# Altium footprint library bethu.PcbLib: 628 footprints (part 1 of 40)
Each footprint in its own frame and in the unit in brackets; x right, y up, seen from the top. Pads: shape width x height; smd on the part's side, far side on the other; paste and mask are expansions set on the pad; w line width, h text height; cw(c..) or ccw(c..) is an arc to the next point about the centre after c.
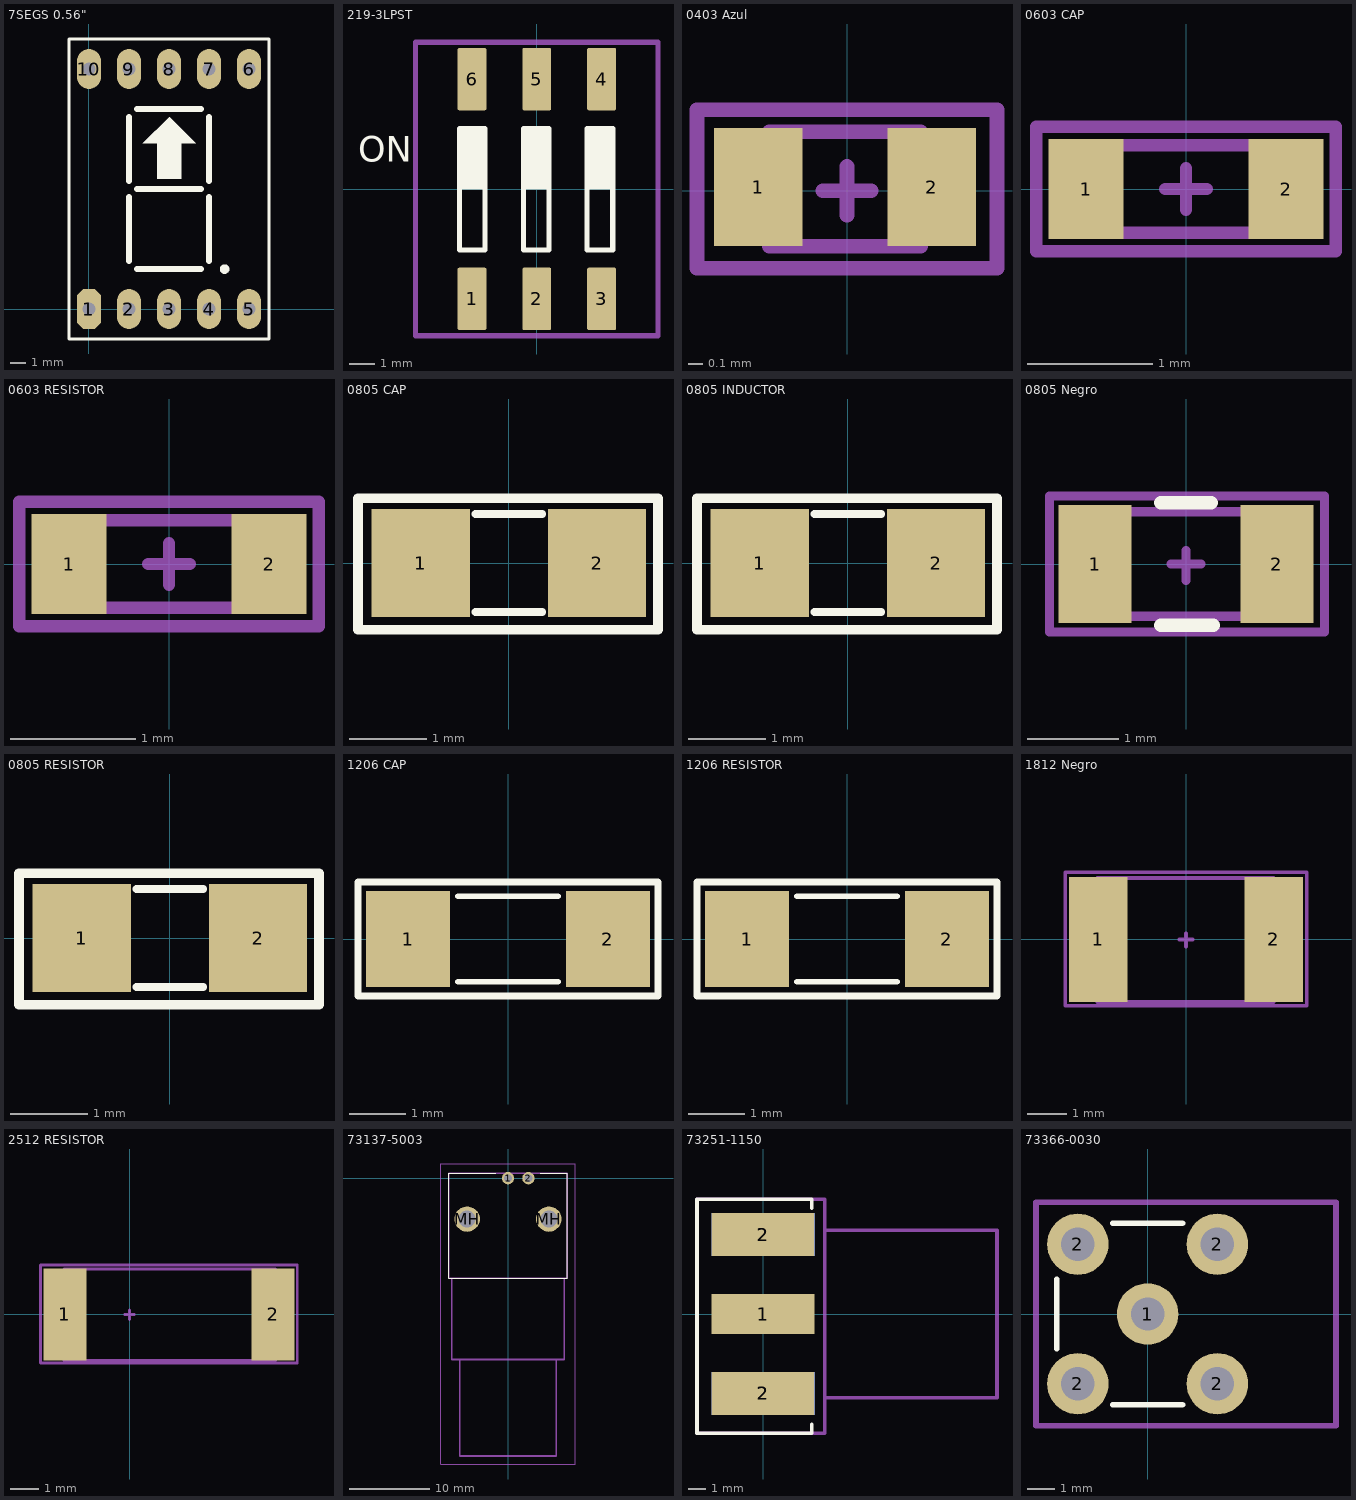
[diagram p0: the footprints below, top view; thin cyan lines are the x and y axes]

## 7SEGS 0.56" [mil] "DIP 10 Leads; Body 12 x 15 mm; Pitch 0.5 mm"
height 300
pads (10):
  oct 60x100 hole 32: 1(0.01,0.01)
  oval 60x100 hole 32: 2(100.01,0.01) 3(200.01,0.01) 4(300.01,0.01) 5(400.01,0.01) 6(400.01,600.01) 7(300.01,600.01) 8(200.01,600.01) 9(100.01,600.01) 10(0.01,600.01)
Top Overlay:
  circle w12: c339.01,100.01 r6
  region: 134.01,414.01 200.01,480.01 202.01,480.01 267.01,415.01 267.01,414.01 230.01,414.01 230.01,326.01 171.01,326.01 171.01,414.01
  lines w7: -49.99,-74.8 450.01,-74.8 450.01,675.01 -49.99,675.01 -49.99,-74.8
  lines w15: 100.01,120.01 100.01,280.01 ; 100.01,120.01 100.01,280.01 ; 100.01,120.01 100.01,280.01 ; 100.01,120.01 100.01,280.01 ; 100.01,120.01 100.01,280.01 ; 100.01,120.01 100.01,280.01 ; 100.01,120.01 100.01,280.01 ; 100.01,120.01 100.01,280.01 ; 100.01,320.01 100.01,480.01 ; 100.01,320.01 100.01,480.01 ; 100.01,320.01 100.01,480.01 ; 100.01,320.01 100.01,480.01 ; 100.01,320.01 100.01,480.01 ; 100.01,320.01 100.01,480.01 ; 100.01,320.01 100.01,480.01 ; 100.01,320.01 100.01,480.01 ; 120.01,100.01 280.01,100.01 ; 120.01,100.01 280.01,100.01 ; 120.01,100.01 280.01,100.01 ; 120.01,100.01 280.01,100.01 ; 120.01,300.01 280.01,300.01 ; 120.01,300.01 280.01,300.01 ; 120.01,300.01 280.01,300.01 ; 120.01,300.01 280.01,300.01 ; 120.01,300.01 280.01,300.01 ; 120.01,300.01 280.01,300.01 ; 120.01,300.01 280.01,300.01 ; 120.01,300.01 280.01,300.01 ; 120.01,500.01 280.01,500.01 ; 120.01,500.01 280.01,500.01 ; 120.01,500.01 280.01,500.01 ; 120.01,500.01 280.01,500.01 ; 300.01,120.01 300.01,280.01 ; 300.01,120.01 300.01,280.01 ; 300.01,120.01 300.01,280.01 ; 300.01,120.01 300.01,280.01 ; 300.01,120.01 300.01,280.01 ; 300.01,120.01 300.01,280.01 ; 300.01,120.01 300.01,280.01 ; 300.01,120.01 300.01,280.01 ; 300.01,320.01 300.01,480.01 ; 300.01,320.01 300.01,480.01 ; 300.01,320.01 300.01,480.01 ; 300.01,320.01 300.01,480.01 ; 300.01,320.01 300.01,480.01 ; 300.01,320.01 300.01,480.01 ; 300.01,320.01 300.01,480.01 ; 300.01,320.01 300.01,480.01
3D body "SW3dPS-Disp_SA56-11.STEP": height 316.25, standoff -156.19, extent -49.99,-74.99 450.01,675.01

## 219-3LPST [mm]
pads (6):
  rrect10% 1.13x2.44 smd mask+0: 1(-2.54,-4.305) 2(0,-4.305) 3(2.54,-4.305) 4(2.54,4.305) 5(0,4.305) 6(-2.54,4.305)
Top Overlay:
  region: 1.975,2.365 2.975,2.365 2.975,-0.01 1.975,-0.01
  region: -0.525,2.365 0.475,2.365 0.475,-0.01 -0.525,-0.01
  region: -3.025,2.365 -2.025,2.365 -2.025,-0.01 -3.025,-0.01
  lines w0.2: -3.025,-2.385 -2.025,-2.385 -2.025,2.365 -3.025,2.365 -3.025,-2.385 ; -0.525,-2.385 0.475,-2.385 0.475,2.365 -0.525,2.365 -0.525,-2.385 ; 1.975,-2.385 2.975,-2.385 2.975,2.365 1.975,2.365 1.975,-2.385
  text "ON" at -7.008,1.075 h1
Mechanical 13:
  lines w0.2: -4.75,-5.75 4.75,-5.75 4.75,-5.25 4.75,5.75 -4.75,5.75 -4.75,-5.75
  text "'.Designator'" at -5.84,-0.925 h1
3D body "219-3poles.stp": height 4.31, standoff 0.01, extent -4.545,-4.955 4.545,4.955

## 0403 Azul [mm] "Chip Resistor, Empaque 0403"
height 0.3
pads (2):
  rect 0.6x0.8 smd: 1(-0.6,0.025) 2(0.575,0.025)
Mechanical 13:
  lines w0.1: -0.525,-0.375 -0.525,0.4 0.5,0.4 0.5,-0.375 -0.525,-0.375
Mechanical 15:
  lines w0.1: -0.165,0 0.165,0 ; 0,-0.165 0,0.165 ; -1.016,-0.525 -1.016,0.55 1.016,0.55 1.016,-0.525 -1.016,-0.525
3D body "0403.STEP": height 0.85, standoff -0.01, extent -0.525,-0.425 0.491,0.439
3D body "0403.STEP": height 0.73, standoff -0.13, extent -0.525,-0.407 0.491,0.457

## 0603 CAP [mm] "Chip Resistor, Empaque 0603"
height 0.3
pads (2):
  rect 0.6x0.8 smd: 1(-0.8,0) 2(0.8,0)
Mechanical 13:
  lines w0.1: -0.8,-0.35 0.8,-0.35 0.8,0.35 -0.8,0.35 -0.8,-0.35
Mechanical 15:
  lines w0.1: -0.165,0 0.165,0 ; 0,-0.165 0,0.165 ; -1.2,-0.5 1.2,-0.5 1.2,0.5 -1.2,0.5 -1.2,-0.5
3D body "SW3dPS-0603 SMD Capacitor.STEP": height 0.29, standoff -0.01, extent -0.8,-0.4 0.8,0.4

## 0603 RESISTOR [mm] "Chip Resistor, Empaque 0603"
height 0.3
pads (2):
  rect 0.6x0.8 smd: 1(-0.8,0) 2(0.8,0)
Mechanical 13:
  lines w0.1: -0.8,-0.35 -0.8,0.35 0.8,0.35 0.8,-0.35 -0.8,-0.35
Mechanical 15:
  lines w0.1: -0.165,0 0.165,0 ; 0,-0.165 0,0.165 ; -1.2,-0.5 -1.2,0.5 1.2,0.5 1.2,-0.5 -1.2,-0.5
3D body "0603 SMD Resistor.STEP": height 0.3, standoff 0, extent -0.8,-0.4 0.8,0.4

## 0805 CAP [mil] "Compoment SMD 80x50mil"
height 50
pads (2):
  rect 50x55 smd: 1(-45,0) 2(45,0)
Top Overlay:
  lines w4: -17,-25 17,-25 ; -17,25 17,25
  lines w5: -77,-34 76,-34 76,33 -77,33 -77,-34
3D body "SW3dPS-smt_resistor_packages.STEP": height 24.02, standoff -0.39, extent -39.76,-25 39.77,25

## 0805 INDUCTOR [mil] "Compoment SMD 80x50mil"
height 50
pads (2):
  rect 50x55 smd: 1(-45,0) 2(45,0)
Top Overlay:
  lines w4: -17,-25 17,-25 ; -17,25 17,25
  lines w5: -77,-34 -77,33 76,33 76,-34 -77,-34
3D body "45635.stp": height 33.46, standoff 13.78, extent -39.37,-24.61 39.37,24.6

## 0805 Negro [mm] "Chip Resistor, Empaque 0805"
height 0.3
pads (2):
  rect 0.8x1.3 smd: 1(-1,0) 2(1,0)
Top Overlay:
  lines w0.15: -0.275,-0.675 0.3,-0.675 ; -0.275,0.675 0.275,0.675
Mechanical 13:
  lines w0.1: -1,-0.575 -1,0.575 1,0.575 1,-0.575 -1,-0.575
Mechanical 15:
  lines w0.1: -0.165,0 0.165,0 ; 0,-0.18 0,0.15 ; -1.5,-0.75 -1.5,0.75 1.525,0.75 1.525,-0.75 -1.5,-0.75
3D body "0805 SMD Resistor.STEP": height 0.78, standoff 0, extent -1,-0.625 1,0.625

## 0805 RESISTOR [mil] "Compoment SMD 80x50mil"
height 50
pads (2):
  rect 50x55 smd: 1(-45,0) 2(45,0)
Top Overlay:
  lines w4: -17,-25 17,-25 ; -17,25 17,25
  lines w5: -77,-34 -77,33 76,33 76,-34 -77,-34
3D body "User Library-Resistors0805.STEP": height 24.11, standoff -0.49, extent -39.43,-25.1 39.43,25.09

## 1206 CAP [mm]
pads (2):
  rect 1.5x1.7 smd: 1(-1.778,0) 2(1.778,0)
Top Overlay:
  lines w0.102: -0.889,-0.762 0.889,-0.762 ; -0.889,0.762 0.889,0.762
  lines w0.127: -2.667,-1.016 2.667,-1.016 2.667,1.016 -2.667,1.016 -2.667,-1.016
3D body "SW3dPS-1206 SMD Capacitor.STEP": height 1, standoff 0, extent -1.6,-0.8 1.6,0.8

## 1206 RESISTOR [mm]
pads (2):
  rect 1.5x1.7 smd: 1(-1.778,0) 2(1.778,0)
Top Overlay:
  lines w0.102: -0.889,-0.762 0.889,-0.762 ; -0.889,0.762 0.889,0.762
  lines w0.127: -2.667,-1.016 -2.667,1.016 2.667,1.016 2.667,-1.016 -2.667,-1.016
3D body "1206 SMD Resistor.STEP": height 1, standoff 0, extent -1.6,-0.8 1.6,0.8

## 1812 Negro [mm] "Chip Resistor, Empaque 1812"
height 0.3
pads (2):
  rect 1.5x3.2 smd: 1(-2.25,0) 2(2.25,0)
Mechanical 13:
  lines w0.1: -2.275,-1.6 -2.275,1.575 2.25,1.575 2.25,-1.6 -2.275,-1.6
Mechanical 15:
  lines w0.1: -0.165,0 0.165,0 ; 0,-0.18 0,0.15 ; 3.075,1.725 -3.1,1.725 -3.1,-1.7 3.1,-1.7 3.1,1.725
3D body "1812 SMD Resistor.STEP": height 1.6, standoff 0, extent -2.25,-1.6 2.25,1.6

## 2512 RESISTOR [mm]
pads (2):
  rect 1.5x3.2 smd: 1(-2.25,0) 2(5,0)
Mechanical 13:
  lines w0.1: -2.286,-1.6 -2.286,1.575 5.08,1.575 5.08,-1.6 -2.286,-1.6
Mechanical 15:
  lines w0.1: -0.165,0 0.165,0 ; 0,-0.18 0,0.15 ; -3.1,-1.7 -3.1,1.725 5.842,1.725 5.842,-1.7 -3.1,-1.7
3D body "User Library-R_2512.STEP": height 0.6, standoff 0, extent -1.803,-1.6 4.597,1.6

## 73137-5003 [mm]
pads (4):
  round 1.54 hole 0.99: 1(0,0) 2(2.54,0)
  round 3.165 hole 2.11: MH(-5.08,-5.08) MH(5.08,-5.08)
Top Overlay:
  lines w0.1: -1.5,0.64 -7.38,0.64 -7.38,-12.44 7.38,-12.44 7.38,0.64 4,0.64
Mechanical 13:
  lines w0.2: -7.38,-12.44 7.38,-12.44 7.38,0.64 -7.38,0.64 -7.38,-12.44 ; -7,-22.54 7,-22.54 7,-12.44 -7,-12.44 -7,-22.54 ; -6,-34.54 6,-34.54 6,-22.54 -6,-22.54 -6,-34.54
  text "'.Designator'" at -6.315,-6.4 h1
Mechanical 15:
  lines w0.1: -8.38,-35.54 8.38,-35.54 8.38,1.77 -8.38,1.77 -8.38,-35.54
3D body "73137-5003.stp": height 12.51, standoff -4.84, extent -7.38,-33.18 7.38,2

## 73251-1150 [mm]
pads (5):
  rect 5.84x2.29 smd: 1(0,0)
  rect 5.84x2.42 smd: 2(0,-4.5) 2(0,4.5)
  rect 5.84x2.42 smd far side: 2(0,-4.5) 2(0,4.5)
Top Overlay:
  lines w0.2: 2.75,-6.25 2.75,-6.75 ; 2.75,6 2.75,6.5 ; 2.75,-6.75 ccw(c2.75,-6.75) 2.75,-6.75 ; 2.75,-6.75 -3.75,-6.75 -3.75,6.5 2.75,6.5 ; 2.75,6.5 ccw(c2.75,6.5) 2.75,6.5
Mechanical 13:
  lines w0.2: 3.5,-4.75 13.25,-4.75 13.25,4.75 3.5,4.75 ; -3.75,-6.75 -3.75,6.5 3.5,6.5 3.5,-6.75 -3.75,-6.75
  text "'.Designator'" at -5.665,-0.417 h1
  text "PCB EDGE" at 4.15,2.1 h0.3
3D body "732511150.stp": height 4.36, standoff -3.57, extent -1.137,-4.75 13.137,4.775

## 73366-0030 [mm]
pads (5):
  round 2.2 hole 1.2: 1(0,0) 2(-2.5,-2.5) 2(-2.5,2.5) 2(2.5,-2.5) 2(2.5,2.5)
Top Overlay:
  lines w0.2: -3.25,-1.25 -3.25,1.25 ; -1.25,-3.25 1.25,-3.25 ; -1.25,3.25 1.25,3.25
Mechanical 13:
  lines w0.2: -4,-4 -4,4 6.75,4 6.75,-4 -4,-4
  text "'.Designator'" at -5.665,-0.417 h1
3D body "733660030.stp": height 6.31, standoff -3.69, extent -3,-3 6.53,3